# Altium footprint library Reflow3D1411sep.PcbLib: 657 footprints (part 19 of 42)
Each footprint in its own frame and in the unit in brackets; x right, y up, seen from the top. Pads: shape width x height; smd on the part's side, far side on the other; paste and mask are expansions set on the pad; w line width, h text height; cw(c..) or ccw(c..) is an arc to the next point about the centre after c.
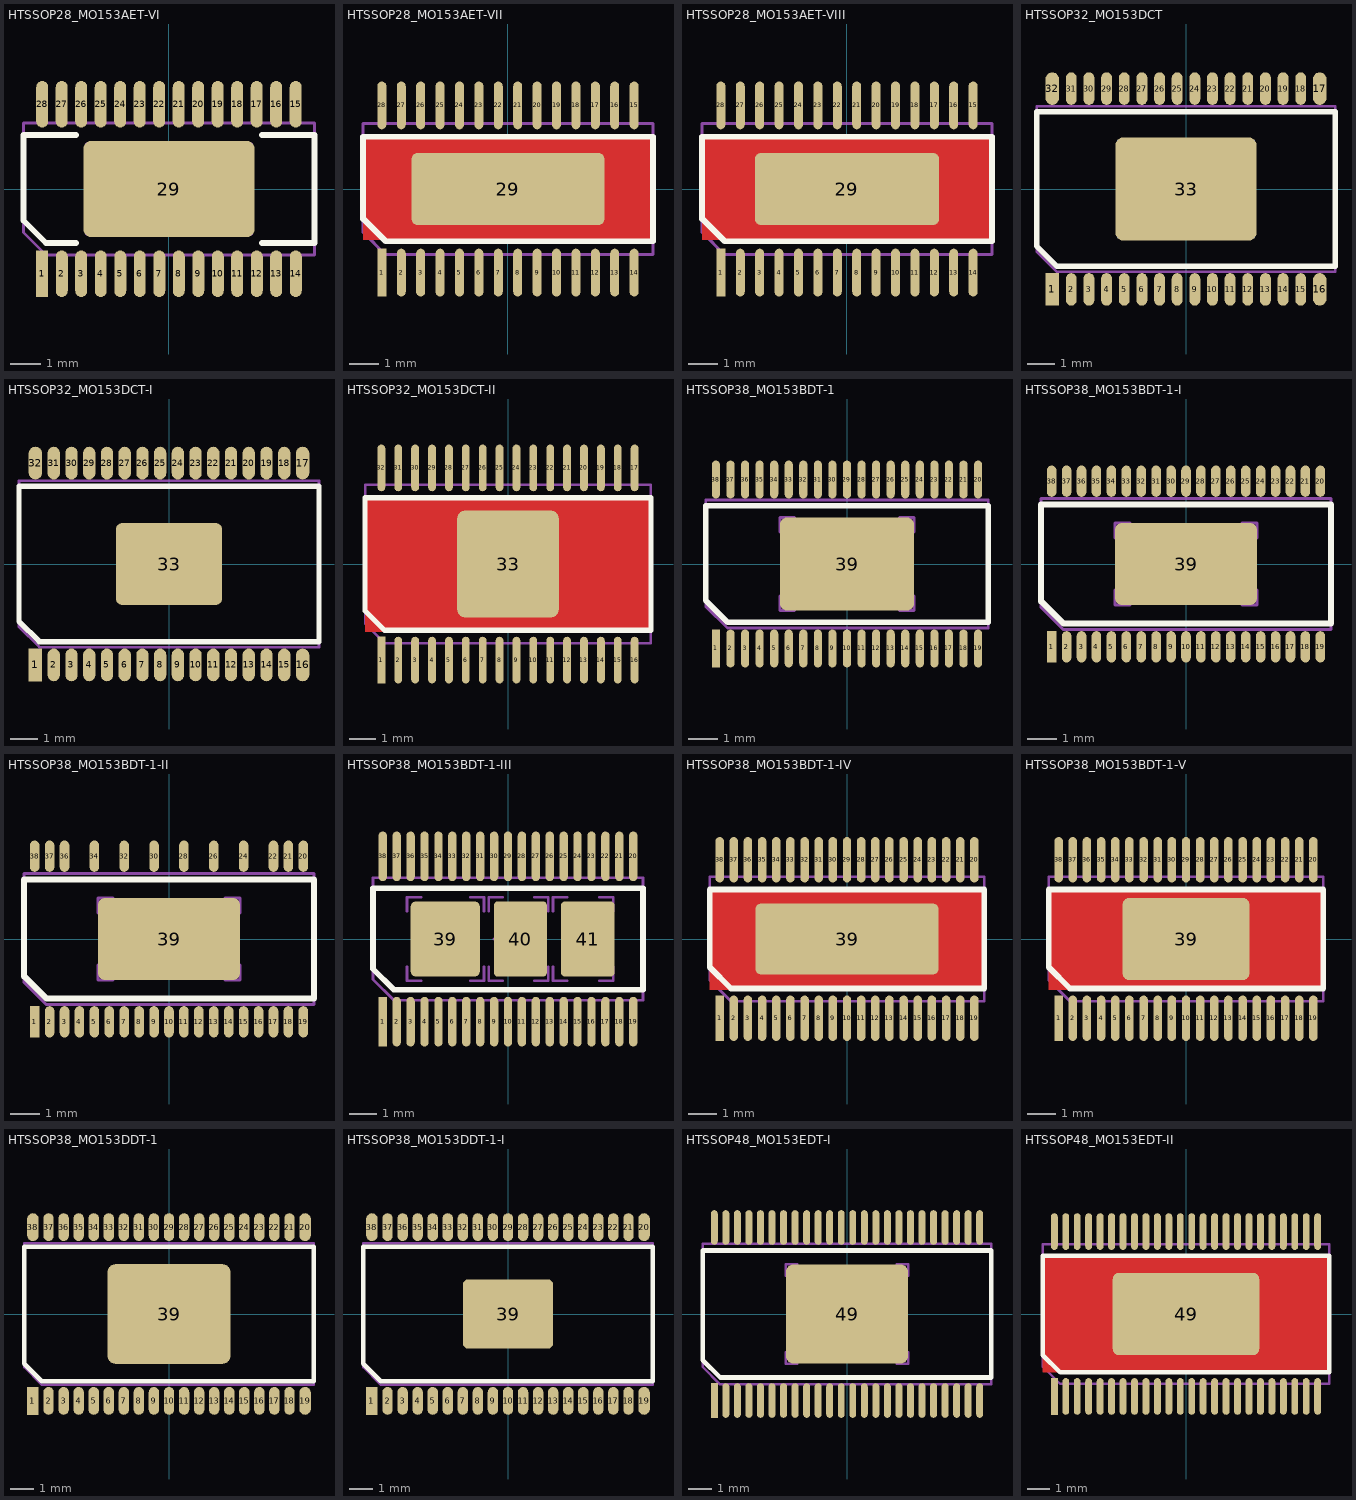
[diagram p18: the footprints below, top view; thin cyan lines are the x and y axes]

## HTSSOP28_MO153AET-VI [mm] "www.semtech.com, sc2446.pdf; www.jedec.org, MO-153f.pdf"
height 1.1
pads (29):
  rect 0.4x1.55 smd mask+0.05: 1(-4.225,-2.825)
  oval 0.4x1.55 smd mask+0.05: 2(-3.575,-2.825) 3(-2.925,-2.825) 4(-2.275,-2.825) 5(-1.625,-2.825) 6(-0.975,-2.825) 7(-0.325,-2.825) 8(0.325,-2.825) 9(0.975,-2.825) 10(1.625,-2.825) 11(2.275,-2.825) 12(2.925,-2.825) 13(3.575,-2.825) 14(4.225,-2.825) 15(4.225,2.825) 16(3.575,2.825) 17(2.925,2.825) 18(2.275,2.825) 19(1.625,2.825) 20(0.975,2.825) 21(0.325,2.825) 22(-0.325,2.825) 23(-0.975,2.825) 24(-1.625,2.825) 25(-2.275,2.825) 26(-2.925,2.825) 27(-3.575,2.825) 28(-4.225,2.825)
  rrect15% 5.7x3.2 smd mask+0.075: 29(0,0)
Top Overlay:
  lines w0.2: -3.1,-1.8 -4.1,-1.8 -4.85,-1.05 -4.85,1.8 -3.1,1.8 ; 3.1,-1.8 4.85,-1.8 4.85,1.8 3.1,1.8
Mechanical 13:
  lines w0.1: -2.75,-1 -2.75,-1.5 -2.25,-1.5 ; -2.75,1 -2.75,1.5 -2.25,1.5 ; 2.25,-1.5 2.75,-1.5 2.75,-1 ; 2.25,1.5 2.75,1.5 2.75,1 ; -4.85,-1.45 -4.1,-2.2 4.85,-2.2 4.85,2.2 -4.85,2.2 -4.85,-1.45
Mechanical 15:
  lines w0.1: -0.5,0 0.5,0 ; 0,-0.5 0,0.5
3D body: height 1.2, standoff 0, extent -4.9,-2.25 4.9,2.25

## HTSSOP28_MO153AET-VII [mm] "www.ti.com, slvs397c.pdf"
height 1.1
pads (29):
  rect 0.3x1.6 smd mask+0.075: 1(-4.225,-2.8)
  oval 0.3x1.6 smd mask+0.075: 2(-3.575,-2.8) 3(-2.925,-2.8) 4(-2.275,-2.8) 5(-1.625,-2.8) 6(-0.975,-2.8) 7(-0.325,-2.8) 8(0.325,-2.8) 9(0.975,-2.8) 10(1.625,-2.8) 11(2.275,-2.8) 12(2.925,-2.8) 13(3.575,-2.8) 14(4.225,-2.8) 15(4.225,2.8) 16(3.575,2.8) 17(2.925,2.8) 18(2.275,2.8) 19(1.625,2.8) 20(0.975,2.8) 21(0.325,2.8) 22(-0.325,2.8) 23(-0.975,2.8) 24(-1.625,2.8) 25(-2.275,2.8) 26(-2.925,2.8) 27(-3.575,2.8) 28(-4.225,2.8)
  rrect15% 6.46x2.4 smd mask+0: 29(0,0)
Top Layer:
  region: -4.85,1.7 4.85,1.7 4.85,-1.7 -4.85,-1.7
Top Overlay:
  lines w0.2: -4.85,-1 -4.1,-1.75 4.85,-1.75 4.85,1.75 -4.85,1.75 -4.85,-1
Mechanical 13:
  lines w0.1: -2.955,-0.5 -2.955,-1 -2.455,-1 ; -2.955,0.5 -2.955,1 -2.455,1 ; 2.455,-1 2.955,-1 2.955,-0.5 ; 2.455,1 2.955,1 2.955,0.5 ; -4.85,-1.45 -4.85,2.2 4.85,2.2 4.85,-2.2 -4.1,-2.2 -4.85,-1.45
Mechanical 15:
  lines w0.1: -0.5,0 0.5,0 ; 0,-0.5 0,0.5
3D body: height 1.2, standoff 0, extent -4.9,-2.25 4.9,2.25

## HTSSOP28_MO153AET-VIII [mm] "www.ti.com, tps54974.pdf"
height 1.1
pads (29):
  rect 0.3x1.6 smd mask+0.075: 1(-4.225,-2.8)
  oval 0.3x1.6 smd mask+0.075: 2(-3.575,-2.8) 3(-2.925,-2.8) 4(-2.275,-2.8) 5(-1.625,-2.8) 6(-0.975,-2.8) 7(-0.325,-2.8) 8(0.325,-2.8) 9(0.975,-2.8) 10(1.625,-2.8) 11(2.275,-2.8) 12(2.925,-2.8) 13(3.575,-2.8) 14(4.225,-2.8) 15(4.225,2.8) 16(3.575,2.8) 17(2.925,2.8) 18(2.275,2.8) 19(1.625,2.8) 20(0.975,2.8) 21(0.325,2.8) 22(-0.325,2.8) 23(-0.975,2.8) 24(-1.625,2.8) 25(-2.275,2.8) 26(-2.925,2.8) 27(-3.575,2.8) 28(-4.225,2.8)
  rrect15% 6.17x2.4 smd mask+0: 29(0,0)
Top Layer:
  region: -4.85,1.7 4.85,1.7 4.85,-1.7 -4.85,-1.7
Top Overlay:
  lines w0.2: -4.85,-1 -4.1,-1.75 4.85,-1.75 4.85,1.75 -4.85,1.75 -4.85,-1
Mechanical 13:
  lines w0.1: -2.86,-0.475 -2.86,-0.975 -2.36,-0.975 ; -2.86,0.475 -2.86,0.975 -2.36,0.975 ; 2.36,-0.975 2.86,-0.975 2.86,-0.475 ; 2.36,0.975 2.86,0.975 2.86,0.475 ; -4.85,-1.45 -4.85,2.2 4.85,2.2 4.85,-2.2 -4.1,-2.2 -4.85,-1.45
Mechanical 15:
  lines w0.1: -0.5,0 0.5,0 ; 0,-0.5 0,0.5
3D body: height 1.2, standoff 0, extent -4.9,-2.25 4.9,2.25

## HTSSOP32_MO153DCT [mm] "www.nxp.com, sot549-1_po.pdf, SOT549-1_fr.pdf"
height 1
pads (33):
  rect 0.5x1.2 smd mask+0.05: 1(-4.925,-3.7)
  oval 0.4x1.2 smd mask+0.05: 2(-4.225,-3.7) 3(-3.575,-3.7) 4(-2.925,-3.7) 5(-2.275,-3.7) 6(-1.625,-3.7) 7(-0.975,-3.7) 8(-0.325,-3.7) 9(0.325,-3.7) 10(0.975,-3.7) 11(1.625,-3.7) 12(2.275,-3.7) 13(2.925,-3.7) 14(3.575,-3.7) 15(4.225,-3.7) 18(4.225,3.7) 19(3.575,3.7) 20(2.925,3.7) 21(2.275,3.7) 22(1.625,3.7) 23(0.975,3.7) 24(0.325,3.7) 25(-0.325,3.7) 26(-0.975,3.7) 27(-1.625,3.7) 28(-2.275,3.7) 29(-2.925,3.7) 30(-3.575,3.7) 31(-4.225,3.7)
  oval 0.5x1.2 smd mask+0.05: 16(4.925,-3.7) 17(4.925,3.7) 32(-4.925,3.7)
  rrect15% 5.2x3.8 smd paste-25.4 mask+0.075: 33(0,0)
Top Overlay:
  lines w0.2: -5.5,-2.1 -5.5,2.85 5.5,2.85 5.5,-2.85 -4.75,-2.85 -5.5,-2.1
Top Paste:
  region: 2.55,-1.85 2.55,-1.05 1.55,-1.05 1.55,-1.85
  region: -2.55,-1.05 -2.55,-1.85 -1.55,-1.85 -1.55,-1.05
  region: 1.175,-1.85 1.175,-1.05 0.175,-1.05 0.175,-1.85
  region: -1.175,-1.05 -1.175,-1.85 -0.175,-1.85 -0.175,-1.05
  region: 1.175,1.05 1.175,1.85 0.175,1.85 0.175,1.05
  region: -1.175,1.85 -1.175,1.05 -0.175,1.05 -0.175,1.85
  region: 2.55,1.05 2.55,1.85 1.55,1.85 1.55,1.05
  region: -2.55,1.85 -2.55,1.05 -1.55,1.05 -1.55,1.85
  region: -2.55,0.4 -2.55,-0.4 -1.55,-0.4 -1.55,0.4
  region: 2.55,-0.4 2.55,0.4 1.55,0.4 1.55,-0.4
  region: -1.175,0.4 -1.175,-0.4 -0.175,-0.4 -0.175,0.4
  region: 1.175,-0.4 1.175,0.4 0.175,0.4 0.175,-0.4
Mechanical 13:
  lines w0.1: -2.5,-1.25 -2.5,-1.75 -2,-1.75 ; -2.5,1.25 -2.5,1.75 -2,1.75 ; 2,-1.75 2.5,-1.75 2.5,-1.25 ; 2,1.75 2.5,1.75 2.5,1.25 ; -5.5,-2.3 -5.5,3.05 5.5,3.05 5.5,-3.05 -4.75,-3.05 -5.5,-2.3
Mechanical 15:
  lines w0.1: -0.5,0 0.5,0 ; 0,-0.5 0,0.5
3D body: height 1.1, standoff 0, extent -5.55,-3.1 5.55,3.1

## HTSSOP32_MO153DCT-I [mm] "www.nxp.com, sot549-3_po.pdf, SOT549-3_fr.pdf"
height 1
pads (33):
  rect 0.5x1.2 smd mask+0.05: 1(-4.9,-3.7)
  oval 0.45x1.2 smd mask+0.05: 2(-4.225,-3.7) 3(-3.575,-3.7) 4(-2.925,-3.7) 5(-2.275,-3.7) 6(-1.625,-3.7) 7(-0.975,-3.7) 8(-0.325,-3.7) 9(0.325,-3.7) 10(0.975,-3.7) 11(1.625,-3.7) 12(2.275,-3.7) 13(2.925,-3.7) 14(3.575,-3.7) 15(4.225,-3.7) 18(4.225,3.7) 19(3.575,3.7) 20(2.925,3.7) 21(2.275,3.7) 22(1.625,3.7) 23(0.975,3.7) 24(0.325,3.7) 25(-0.325,3.7) 26(-0.975,3.7) 27(-1.625,3.7) 28(-2.275,3.7) 29(-2.925,3.7) 30(-3.575,3.7) 31(-4.225,3.7)
  oval 0.5x1.2 smd mask+0.05: 16(4.9,-3.7) 17(4.9,3.7) 32(-4.9,3.7)
  rrect15% 3.9x3 smd paste-25.4 mask+0.075: 33(0,0)
Top Overlay:
  lines w0.2: -5.5,-2.1 -4.75,-2.85 5.5,-2.85 5.5,2.85 -5.5,2.85 -5.5,-2.1
Top Paste:
  region: 0.45,-0.35 0.45,0.35 -0.45,0.35 -0.45,-0.35
  region: 1.9,-0.35 1.9,0.35 1,0.35 1,-0.35
  region: 1.9,0.75 1.9,1.45 1,1.45 1,0.75
  region: -1.9,0.35 -1.9,-0.35 -1,-0.35 -1,0.35
  region: -1.9,1.45 -1.9,0.75 -1,0.75 -1,1.45
  region: 0.45,0.75 0.45,1.45 -0.45,1.45 -0.45,0.75
  region: -0.45,-0.75 -0.45,-1.45 0.45,-1.45 0.45,-0.75
  region: 1.9,-1.45 1.9,-0.75 1,-0.75 1,-1.45
  region: -1.9,-0.75 -1.9,-1.45 -1,-1.45 -1,-0.75
Mechanical 13:
  lines w0.1: -1.775,-0.875 -1.775,-1.375 -1.275,-1.375 ; -1.775,0.875 -1.775,1.375 -1.275,1.375 ; 1.275,-1.375 1.775,-1.375 1.775,-0.875 ; 1.275,1.375 1.775,1.375 1.775,0.875 ; -5.5,-2.3 -4.75,-3.05 5.5,-3.05 5.5,3.05 -5.5,3.05 -5.5,-2.3
Mechanical 15:
  lines w0.1: -0.5,0 0.5,0 ; 0,-0.5 0,0.5
3D body: height 1.1, standoff 0, extent -5.55,-3.1 5.55,3.1

## HTSSOP32_MO153DCT-II [mm] "www.ti.com, tlc5922.pdf"
height 1.1
pads (33):
  rect 0.3x1.8 smd mask+0.075: 1(-4.875,-3.7)
  oval 0.3x1.8 smd mask+0.075: 2(-4.225,-3.7) 3(-3.575,-3.7) 4(-2.925,-3.7) 5(-2.275,-3.7) 6(-1.625,-3.7) 7(-0.975,-3.7) 8(-0.325,-3.7) 9(0.325,-3.7) 10(0.975,-3.7) 11(1.625,-3.7) 12(2.275,-3.7) 13(2.925,-3.7) 14(3.575,-3.7) 15(4.225,-3.7) 16(4.875,-3.7) 17(4.875,3.7) 18(4.225,3.7) 19(3.575,3.7) 20(2.925,3.7) 21(2.275,3.7) 22(1.625,3.7) 23(0.975,3.7) 24(0.325,3.7) 25(-0.325,3.7) 26(-0.975,3.7) 27(-1.625,3.7) 28(-2.275,3.7) 29(-2.925,3.7) 30(-3.575,3.7) 31(-4.225,3.7) 32(-4.875,3.7)
  rrect15% 3.91x4.11 smd mask+0: 33(0,0)
Top Layer:
  region: -5.5,2.6 5.5,2.6 5.5,-2.6 -5.5,-2.6
Top Overlay:
  lines w0.2: -5.5,-1.8 -4.75,-2.55 5.5,-2.55 5.5,2.55 -5.5,2.55 -5.5,-1.8
Mechanical 13:
  lines w0.1: -1.805,-1.365 -1.805,-1.865 -1.305,-1.865 ; -1.805,1.365 -1.805,1.865 -1.305,1.865 ; 1.305,-1.865 1.805,-1.865 1.805,-1.365 ; 1.305,1.865 1.805,1.865 1.805,1.365 ; -5.5,-2.3 -4.75,-3.05 5.5,-3.05 5.5,3.05 -5.5,3.05 -5.5,-2.3
Mechanical 15:
  lines w0.1: -0.5,0 0.5,0 ; 0,-0.5 0,0.5
3D body: height 1.2, standoff 0, extent -5.55,-3.1 5.55,3.1

## HTSSOP38_MO153BDT-1 [mm] "www.intersil.com, M38.173C.pdf"
height 1
pads (39):
  rect 0.28x1.3 smd mask+0.05: 1(-4.5,-2.9)
  oval 0.28x1.3 smd mask+0.05: 2(-4,-2.9) 3(-3.5,-2.9) 4(-3,-2.9) 5(-2.5,-2.9) 6(-2,-2.9) 7(-1.5,-2.9) 8(-1,-2.9) 9(-0.5,-2.9) 10(0,-2.9) 11(0.5,-2.9) 12(1,-2.9) 13(1.5,-2.9) 14(2,-2.9) 15(2.5,-2.9) 16(3,-2.9) 17(3.5,-2.9) 18(4,-2.9) 19(4.5,-2.9) 20(4.5,2.9) 21(4,2.9) 22(3.5,2.9) 23(3,2.9) 24(2.5,2.9) 25(2,2.9) 26(1.5,2.9) 27(1,2.9) 28(0.5,2.9) 29(0,2.9) 30(-0.5,2.9) 31(-1,2.9) 32(-1.5,2.9) 33(-2,2.9) 34(-2.5,2.9) 35(-3,2.9) 36(-3.5,2.9) 37(-4,2.9) 38(-4.5,2.9)
  rrect15% 4.6x3.2 smd mask+0.075: 39(0,0)
Top Overlay:
  lines w0.2: -4.85,-1.25 -4.1,-2 4.85,-2 4.85,2 -4.85,2 -4.85,-1.25
Mechanical 13:
  lines w0.1: -2.3,-1.1 -2.3,-1.6 -1.8,-1.6 ; -2.3,1.1 -2.3,1.6 -1.8,1.6 ; 1.8,-1.6 2.3,-1.6 2.3,-1.1 ; 1.8,1.6 2.3,1.6 2.3,1.1 ; -4.85,-1.45 -4.1,-2.2 4.85,-2.2 4.85,2.2 -4.85,2.2 -4.85,-1.45
Mechanical 15:
  lines w0.1: -0.5,0 0.5,0 ; 0,-0.5 0,0.5
3D body: height 1.1, standoff 0, extent -4.9,-2.25 4.9,2.25

## HTSSOP38_MO153BDT-1-I [mm] "www.linear.com, TSSOP_38_05-08-1772.pdf"
height 1.1
pads (39):
  rect 0.32x1.05 smd mask+0.075: 1(-4.5,-2.775)
  oval 0.32x1.05 smd mask+0.075: 2(-4,-2.775) 3(-3.5,-2.775) 4(-3,-2.775) 5(-2.5,-2.775) 6(-2,-2.775) 7(-1.5,-2.775) 8(-1,-2.775) 9(-0.5,-2.775) 10(0,-2.775) 11(0.5,-2.775) 12(1,-2.775) 13(1.5,-2.775) 14(2,-2.775) 15(2.5,-2.775) 16(3,-2.775) 17(3.5,-2.775) 18(4,-2.775) 19(4.5,-2.775) 20(4.5,2.775) 21(4,2.775) 22(3.5,2.775) 23(3,2.775) 24(2.5,2.775) 25(2,2.775) 26(1.5,2.775) 27(1,2.775) 28(0.5,2.775) 29(0,2.775) 30(-0.5,2.775) 31(-1,2.775) 32(-1.5,2.775) 33(-2,2.775) 34(-2.5,2.775) 35(-3,2.775) 36(-3.5,2.775) 37(-4,2.775) 38(-4.5,2.775)
  rrect15% 4.75x2.74 smd mask+0.075: 39(0,0)
Top Overlay:
  lines w0.2: -4.85,-1.25 -4.1,-2 4.85,-2 4.85,2 -4.85,2 -4.85,-1.25
Top Solder:
  region: -4.285,3.225 -4.285,2.325 -4.215,2.325 -4.215,3.225
  region: -3.785,3.225 -3.785,2.325 -3.715,2.325 -3.715,3.225
  region: -3.285,3.225 -3.285,2.325 -3.215,2.325 -3.215,3.225
  region: -2.785,3.225 -2.785,2.325 -2.715,2.325 -2.715,3.225
  region: -2.285,3.225 -2.285,2.325 -2.215,2.325 -2.215,3.225
  region: -1.785,3.225 -1.785,2.325 -1.715,2.325 -1.715,3.225
  region: -1.285,3.225 -1.285,2.325 -1.215,2.325 -1.215,3.225
  region: -0.785,3.225 -0.785,2.325 -0.715,2.325 -0.715,3.225
  region: -0.285,3.225 -0.285,2.325 -0.215,2.325 -0.215,3.225
  region: 0.215,3.225 0.215,2.325 0.285,2.325 0.285,3.225
  region: 0.715,3.225 0.715,2.325 0.785,2.325 0.785,3.225
  region: 1.215,3.225 1.215,2.325 1.285,2.325 1.285,3.225
  region: 1.715,3.225 1.715,2.325 1.785,2.325 1.785,3.225
  region: 2.215,3.225 2.215,2.325 2.285,2.325 2.285,3.225
  region: 2.715,3.225 2.715,2.325 2.785,2.325 2.785,3.225
  region: 3.215,3.225 3.215,2.325 3.285,2.325 3.285,3.225
  region: 3.715,3.225 3.715,2.325 3.785,2.325 3.785,3.225
  region: 4.215,3.225 4.215,2.325 4.285,2.325 4.285,3.225
  region: 4.215,-2.325 4.215,-3.225 4.285,-3.225 4.285,-2.325
  region: 3.715,-2.325 3.715,-3.225 3.785,-3.225 3.785,-2.325
  region: 3.215,-2.325 3.215,-3.225 3.285,-3.225 3.285,-2.325
  region: 2.715,-2.325 2.715,-3.225 2.785,-3.225 2.785,-2.325
  region: 2.215,-2.325 2.215,-3.225 2.285,-3.225 2.285,-2.325
  region: 1.715,-2.325 1.715,-3.225 1.785,-3.225 1.785,-2.325
  region: 1.215,-2.325 1.215,-3.225 1.285,-3.225 1.285,-2.325
  region: 0.715,-2.325 0.715,-3.225 0.785,-3.225 0.785,-2.325
  region: 0.215,-2.325 0.215,-3.225 0.285,-3.225 0.285,-2.325
  region: -0.285,-2.325 -0.285,-3.225 -0.215,-3.225 -0.215,-2.325
  region: -0.785,-2.325 -0.785,-3.225 -0.715,-3.225 -0.715,-2.325
  region: -1.285,-2.325 -1.285,-3.225 -1.215,-3.225 -1.215,-2.325
  region: -1.785,-2.325 -1.785,-3.225 -1.715,-3.225 -1.715,-2.325
  region: -2.285,-2.325 -2.285,-3.225 -2.215,-3.225 -2.215,-2.325
  region: -2.785,-2.325 -2.785,-3.225 -2.715,-3.225 -2.715,-2.325
  region: -3.285,-2.325 -3.285,-3.225 -3.215,-3.225 -3.215,-2.325
  region: -3.785,-2.325 -3.785,-3.225 -3.715,-3.225 -3.715,-2.325
  region: -4.27,-2.325 -4.27,-3.225 -4.215,-3.225 -4.215,-2.325
Mechanical 13:
  lines w0.1: -2.375,-0.87 -2.375,-1.37 -1.875,-1.37 ; -2.375,0.87 -2.375,1.37 -1.875,1.37 ; 1.875,-1.37 2.375,-1.37 2.375,-0.87 ; 1.875,1.37 2.375,1.37 2.375,0.87 ; -4.85,-1.45 -4.1,-2.2 4.85,-2.2 4.85,2.2 -4.85,2.2 -4.85,-1.45
Mechanical 15:
  lines w0.1: -0.5,0 0.5,0 ; 0,-0.5 0,0.5
3D body: height 1.2, standoff 0, extent -4.9,-2.25 4.9,2.25

## HTSSOP38_MO153BDT-1-II [mm] "www.linear.com, TSSOP_38_05-08-1865.pdf"
height 1.1
pads (32):
  rect 0.32x1.05 smd mask+0.075: 1(-4.5,-2.775)
  oval 0.32x1.05 smd mask+0.075: 2(-4,-2.775) 3(-3.5,-2.775) 4(-3,-2.775) 5(-2.5,-2.775) 6(-2,-2.775) 7(-1.5,-2.775) 8(-1,-2.775) 9(-0.5,-2.775) 10(0,-2.775) 11(0.5,-2.775) 12(1,-2.775) 13(1.5,-2.775) 14(2,-2.775) 15(2.5,-2.775) 16(3,-2.775) 17(3.5,-2.775) 18(4,-2.775) 19(4.5,-2.775) 20(4.5,2.775) 21(4,2.775) 22(3.5,2.775) 24(2.5,2.775) 26(1.5,2.775) 28(0.5,2.775) 30(-0.5,2.775) 32(-1.5,2.775) 34(-2.5,2.775) 36(-3.5,2.775) 37(-4,2.775) 38(-4.5,2.775)
  rrect15% 4.75x2.74 smd mask+0.075: 39(0,0)
Top Overlay:
  lines w0.2: -4.85,-1.25 -4.85,2 4.85,2 4.85,-2 -4.1,-2 -4.85,-1.25
Top Solder:
  region: -4.27,-2.325 -4.27,-3.225 -4.215,-3.225 -4.215,-2.325
  region: -3.785,-2.325 -3.785,-3.225 -3.715,-3.225 -3.715,-2.325
  region: -3.285,-2.325 -3.285,-3.225 -3.215,-3.225 -3.215,-2.325
  region: -2.785,-2.325 -2.785,-3.225 -2.715,-3.225 -2.715,-2.325
  region: -2.285,-2.325 -2.285,-3.225 -2.215,-3.225 -2.215,-2.325
  region: -1.785,-2.325 -1.785,-3.225 -1.715,-3.225 -1.715,-2.325
  region: -1.285,-2.325 -1.285,-3.225 -1.215,-3.225 -1.215,-2.325
  region: -0.785,-2.325 -0.785,-3.225 -0.715,-3.225 -0.715,-2.325
  region: -0.285,-2.325 -0.285,-3.225 -0.215,-3.225 -0.215,-2.325
  region: 0.215,-2.325 0.215,-3.225 0.285,-3.225 0.285,-2.325
  region: 0.715,-2.325 0.715,-3.225 0.785,-3.225 0.785,-2.325
  region: 1.215,-2.325 1.215,-3.225 1.285,-3.225 1.285,-2.325
  region: 1.715,-2.325 1.715,-3.225 1.785,-3.225 1.785,-2.325
  region: 2.215,-2.325 2.215,-3.225 2.285,-3.225 2.285,-2.325
  region: 2.715,-2.325 2.715,-3.225 2.785,-3.225 2.785,-2.325
  region: 3.215,-2.325 3.215,-3.225 3.285,-3.225 3.285,-2.325
  region: 3.715,-2.325 3.715,-3.225 3.785,-3.225 3.785,-2.325
  region: 4.215,-2.325 4.215,-3.225 4.285,-3.225 4.285,-2.325
  region: 4.215,3.225 4.215,2.325 4.285,2.325 4.285,3.225
  region: 3.715,3.225 3.715,2.325 3.785,2.325 3.785,3.225
  region: -3.785,3.225 -3.785,2.325 -3.715,2.325 -3.715,3.225
  region: -4.285,3.225 -4.285,2.325 -4.215,2.325 -4.215,3.225
Mechanical 13:
  lines w0.1: -2.375,-0.87 -2.375,-1.37 -1.875,-1.37 ; -2.375,0.87 -2.375,1.37 -1.875,1.37 ; 1.875,-1.37 2.375,-1.37 2.375,-0.87 ; 1.875,1.37 2.375,1.37 2.375,0.87 ; -4.85,-1.45 -4.85,2.2 4.85,2.2 4.85,-2.2 -4.1,-2.2 -4.85,-1.45
Mechanical 15:
  lines w0.1: -0.5,0 0.5,0 ; 0,-0.5 0,0.5
3D body: height 1.2, standoff 0, extent -4.9,-2.25 4.9,2.25

## HTSSOP38_MO153BDT-1-III [mm] "www.exar.com, 4b6fe087-c19f-4600-9594-d036ab0f1eee.pdf"
height 1.08
pads (41):
  rect 0.3x1.78 smd mask+0.05: 1(-4.5,-2.97)
  oval 0.3x1.78 smd mask+0.05: 2(-4,-2.97) 3(-3.5,-2.97) 4(-3,-2.97) 5(-2.5,-2.97) 6(-2,-2.97) 7(-1.5,-2.97) 8(-1,-2.97) 9(-0.5,-2.97) 10(0,-2.97) 11(0.5,-2.97) 12(1,-2.97) 13(1.5,-2.97) 14(2,-2.97) 15(2.5,-2.97) 16(3,-2.97) 17(3.5,-2.97) 18(4,-2.97) 19(4.5,-2.97) 20(4.5,2.97) 21(4,2.97) 22(3.5,2.97) 23(3,2.97) 24(2.5,2.97) 25(2,2.97) 26(1.5,2.97) 27(1,2.97) 28(0.5,2.97) 29(0,2.97) 30(-0.5,2.97) 31(-1,2.97) 32(-1.5,2.97) 33(-2,2.97) 34(-2.5,2.97) 35(-3,2.97) 36(-3.5,2.97) 37(-4,2.97) 38(-4.5,2.97)
  rrect15% 2.49x2.7 smd mask+0.075: 39(-2.255,0)
  rrect15% 1.91x2.7 smd mask+0.075: 40(0.445,0)
  rrect15% 1.93x2.7 smd mask+0.075: 41(2.865,0)
Top Overlay:
  lines w0.2: -4.85,-1.075 -4.1,-1.825 4.85,-1.825 4.85,1.825 -4.85,1.825 -4.85,-1.075
Mechanical 13:
  lines w0.1: -3.63,-1 -3.63,-1.5 -3.13,-1.5 ; -3.63,1 -3.63,1.5 -3.13,1.5 ; -1.36,-1.5 -0.86,-1.5 -0.86,-1 ; -1.36,1.5 -0.86,1.5 -0.86,1 ; -0.69,-1 -0.69,-1.5 -0.19,-1.5 ; -0.69,1 -0.69,1.5 -0.19,1.5 ; 0.95,-1.5 1.45,-1.5 1.45,-1 ; 0.95,1.5 1.45,1.5 1.45,1 ; 1.62,-1 1.62,-1.5 2.12,-1.5 ; 1.62,1 1.62,1.5 2.12,1.5 ; 3.28,-1.5 3.78,-1.5 3.78,-1 ; 3.28,1.5 3.78,1.5 3.78,1 ; -4.85,-1.45 -4.1,-2.2 4.85,-2.2 4.85,2.2 -4.85,2.2 -4.85,-1.45
Mechanical 15:
  lines w0.1: -0.5,0 0.5,0 ; 0,-0.5 0,0.5
3D body: height 1.2, standoff 0, extent -4.9,-2.25 4.9,2.25

## HTSSOP38_MO153BDT-1-IV [mm] "www.ti.com, sbos330e.pdf"
height 1.1
pads (39):
  rect 0.3x1.6 smd mask+0.05: 1(-4.5,-2.8)
  oval 0.3x1.6 smd mask+0.05: 2(-4,-2.8) 3(-3.5,-2.8) 4(-3,-2.8) 5(-2.5,-2.8) 6(-2,-2.8) 7(-1.5,-2.8) 8(-1,-2.8) 9(-0.5,-2.8) 10(0,-2.8) 11(0.5,-2.8) 12(1,-2.8) 13(1.5,-2.8) 14(2,-2.8) 15(2.5,-2.8) 16(3,-2.8) 17(3.5,-2.8) 18(4,-2.8) 19(4.5,-2.8) 20(4.5,2.8) 21(4,2.8) 22(3.5,2.8) 23(3,2.8) 24(2.5,2.8) 25(2,2.8) 26(1.5,2.8) 27(1,2.8) 28(0.5,2.8) 29(0,2.8) 30(-0.5,2.8) 31(-1,2.8) 32(-1.5,2.8) 33(-2,2.8) 34(-2.5,2.8) 35(-3,2.8) 36(-3.5,2.8) 37(-4,2.8) 38(-4.5,2.8)
  rrect15% 6.47x2.5 smd mask+0: 39(0,0)
Top Layer:
  region: -4.85,1.8 4.85,1.8 4.85,-1.8 -4.85,-1.8
Top Overlay:
  lines w0.2: -4.85,-1 -4.85,1.75 4.85,1.75 4.85,-1.75 -4.1,-1.75 -4.85,-1
Mechanical 13:
  lines w0.1: -2.86,-0.525 -2.86,-1.025 -2.36,-1.025 ; -2.86,0.525 -2.86,1.025 -2.36,1.025 ; 2.36,-1.025 2.86,-1.025 2.86,-0.525 ; 2.36,1.025 2.86,1.025 2.86,0.525 ; -4.85,-1.45 -4.85,2.2 4.85,2.2 4.85,-2.2 -4.1,-2.2 -4.85,-1.45
Mechanical 15:
  lines w0.1: -0.5,0 0.5,0 ; 0,-0.5 0,0.5
3D body: height 1.2, standoff 0, extent -4.9,-2.25 4.9,2.25

## HTSSOP38_MO153BDT-1-V [mm] "www.ti.com, tas3108.pdf"
height 1.1
pads (39):
  rect 0.3x1.6 smd mask+0.05: 1(-4.5,-2.8)
  oval 0.3x1.6 smd mask+0.05: 2(-4,-2.8) 3(-3.5,-2.8) 4(-3,-2.8) 5(-2.5,-2.8) 6(-2,-2.8) 7(-1.5,-2.8) 8(-1,-2.8) 9(-0.5,-2.8) 10(0,-2.8) 11(0.5,-2.8) 12(1,-2.8) 13(1.5,-2.8) 14(2,-2.8) 15(2.5,-2.8) 16(3,-2.8) 17(3.5,-2.8) 18(4,-2.8) 19(4.5,-2.8) 20(4.5,2.8) 21(4,2.8) 22(3.5,2.8) 23(3,2.8) 24(2.5,2.8) 25(2,2.8) 26(1.5,2.8) 27(1,2.8) 28(0.5,2.8) 29(0,2.8) 30(-0.5,2.8) 31(-1,2.8) 32(-1.5,2.8) 33(-2,2.8) 34(-2.5,2.8) 35(-3,2.8) 36(-3.5,2.8) 37(-4,2.8) 38(-4.5,2.8)
  rrect15% 4.48x2.9 smd mask+0: 39(0,0)
Top Layer:
  region: -4.85,1.8 4.85,1.8 4.85,-1.8 -4.85,-1.8
Top Overlay:
  lines w0.2: -4.85,-1 -4.1,-1.75 4.85,-1.75 4.85,1.75 -4.85,1.75 -4.85,-1
Mechanical 13:
  lines w0.1: -2.16,-0.835 -2.16,-1.335 -1.66,-1.335 ; -2.16,0.835 -2.16,1.335 -1.66,1.335 ; 1.66,-1.335 2.16,-1.335 2.16,-0.835 ; 1.66,1.335 2.16,1.335 2.16,0.835 ; -4.85,-1.45 -4.1,-2.2 4.85,-2.2 4.85,2.2 -4.85,2.2 -4.85,-1.45
Mechanical 15:
  lines w0.1: -0.5,0 0.5,0 ; 0,-0.5 0,0.5
3D body: height 1.2, standoff 0, extent -4.9,-2.25 4.9,2.25

## HTSSOP38_MO153DDT-1 [mm] "www.nxp.com, sot633-1_po.pdf, SOT633-1_fr.pdf; www.jedec.org, MO-153f.pdf"
height 1.03
pads (39):
  rect 0.5x1.2 smd mask+0.05: 1(-5.875,-3.75)
  oval 0.45x1.2 smd mask+0.05: 2(-5.2,-3.75) 3(-4.55,-3.75) 4(-3.9,-3.75) 5(-3.25,-3.75) 6(-2.6,-3.75) 7(-1.95,-3.75) 8(-1.3,-3.75) 9(-0.65,-3.75) 10(0,-3.75) 11(0.65,-3.75) 12(1.3,-3.75) 13(1.95,-3.75) 14(2.6,-3.75) 15(3.25,-3.75) 16(3.9,-3.75) 17(4.55,-3.75) 18(5.2,-3.75) 21(5.2,3.75) 22(4.55,3.75) 23(3.9,3.75) 24(3.25,3.75) 25(2.6,3.75) 26(1.95,3.75) 27(1.3,3.75) 28(0.65,3.75) 29(0,3.75) 30(-0.65,3.75) 31(-1.3,3.75) 32(-1.95,3.75) 33(-2.6,3.75) 34(-3.25,3.75) 35(-3.9,3.75) 36(-4.55,3.75) 37(-5.2,3.75)
  oval 0.5x1.2 smd mask+0.05: 19(5.875,-3.75) 20(5.875,3.75) 38(-5.875,3.75)
  rrect15% 5.3x4.3 smd paste-25.4 mask+0.075: 39(0,0)
Top Overlay:
  lines w0.2: -6.25,-2.15 -5.5,-2.9 6.25,-2.9 6.25,2.9 -6.25,2.9 -6.25,-2.15
Top Paste:
  region: 0.25,0.5 0.25,-0.5 1.15,-0.5 1.15,0.5
  region: -0.25,-0.5 -0.25,0.5 -1.15,0.5 -1.15,-0.5
  region: 1.7,0.5 1.7,-0.5 2.6,-0.5 2.6,0.5
  region: -1.7,-0.5 -1.7,0.5 -2.6,0.5 -2.6,-0.5
  region: -1.7,1.1 -1.7,2.1 -2.6,2.1 -2.6,1.1
  region: 1.7,2.1 1.7,1.1 2.6,1.1 2.6,2.1
  region: -0.25,1.1 -0.25,2.1 -1.15,2.1 -1.15,1.1
  region: 0.25,2.1 0.25,1.1 1.15,1.1 1.15,2.1
  region: -0.25,-2.1 -0.25,-1.1 -1.15,-1.1 -1.15,-2.1
  region: 0.25,-1.1 0.25,-2.1 1.15,-2.1 1.15,-1.1
  region: -1.7,-2.1 -1.7,-1.1 -2.6,-1.1 -2.6,-2.1
  region: 1.7,-1.1 1.7,-2.1 2.6,-2.1 2.6,-1.1
Mechanical 13:
  lines w0.1: -2.5,-1.5 -2.5,-2 -2,-2 ; -2.5,1.5 -2.5,2 -2,2 ; 2,-2 2.5,-2 2.5,-1.5 ; 2,2 2.5,2 2.5,1.5 ; -6.25,-2.3 -6.25,3.05 6.25,3.05 6.25,-3.05 -5.5,-3.05 -6.25,-2.3
Mechanical 15:
  lines w0.1: -0.5,0 0.5,0 ; 0,-0.5 0,0.5
3D body: height 1.2, standoff 0, extent -6.3,-3.1 6.3,3.1

## HTSSOP38_MO153DDT-1-I [mm] "www.nxp.com, SOT633-3.pdf, SOT633-3_fr.pdf"
height 1.03
pads (39):
  rect 0.5x1.2 smd mask+0.05: 1(-5.875,-3.75)
  oval 0.45x1.2 smd mask+0.05: 2(-5.2,-3.75) 3(-4.55,-3.75) 4(-3.9,-3.75) 5(-3.25,-3.75) 6(-2.6,-3.75) 7(-1.95,-3.75) 8(-1.3,-3.75) 9(-0.65,-3.75) 10(0,-3.75) 11(0.65,-3.75) 12(1.3,-3.75) 13(1.95,-3.75) 14(2.6,-3.75) 15(3.25,-3.75) 16(3.9,-3.75) 17(4.55,-3.75) 18(5.2,-3.75) 21(5.2,3.75) 22(4.55,3.75) 23(3.9,3.75) 24(3.25,3.75) 25(2.6,3.75) 26(1.95,3.75) 27(1.3,3.75) 28(0.65,3.75) 29(0,3.75) 30(-0.65,3.75) 31(-1.3,3.75) 32(-1.95,3.75) 33(-2.6,3.75) 34(-3.25,3.75) 35(-3.9,3.75) 36(-4.55,3.75) 37(-5.2,3.75)
  oval 0.5x1.2 smd mask+0.05: 19(5.875,-3.75) 20(5.875,3.75) 38(-5.875,3.75)
  rrect15% 3.9x3 smd paste-25.4 mask+0.075: 39(0,0)
Top Overlay:
  lines w0.2: -6.25,-2.15 -6.25,2.9 6.25,2.9 6.25,-2.9 -5.5,-2.9 -6.25,-2.15
Top Paste:
  region: 0.45,-0.35 0.45,0.35 -0.45,0.35 -0.45,-0.35
  region: 1.9,-0.35 1.9,0.35 1,0.35 1,-0.35
  region: 1.9,0.75 1.9,1.45 1,1.45 1,0.75
  region: -1.9,0.35 -1.9,-0.35 -1,-0.35 -1,0.35
  region: -1.9,1.45 -1.9,0.75 -1,0.75 -1,1.45
  region: 0.45,0.75 0.45,1.45 -0.45,1.45 -0.45,0.75
  region: -0.45,-0.75 -0.45,-1.45 0.45,-1.45 0.45,-0.75
  region: 1.9,-1.45 1.9,-0.75 1,-0.75 1,-1.45
  region: -1.9,-0.75 -1.9,-1.45 -1,-1.45 -1,-0.75
Mechanical 13:
  lines w0.1: -1.775,-0.875 -1.775,-1.375 -1.275,-1.375 ; -1.775,0.875 -1.775,1.375 -1.275,1.375 ; 1.275,-1.375 1.775,-1.375 1.775,-0.875 ; 1.275,1.375 1.775,1.375 1.775,0.875 ; -6.25,-2.3 -5.5,-3.05 6.25,-3.05 6.25,3.05 -6.25,3.05 -6.25,-2.3
Mechanical 15:
  lines w0.1: -0.5,0 0.5,0 ; 0,-0.5 0,0.5
3D body: height 1.2, standoff 0, extent -6.3,-3.1 6.3,3.1

## HTSSOP48_MO153EDT-I [mm] "www.idt.com, PSC4092.pdf"
height 1
pads (49):
  rect 0.3x1.5 smd mask+0.05: 1(-5.75,-3.75)
  oval 0.3x1.5 smd mask+0.05: 2(-5.25,-3.75) 3(-4.75,-3.75) 4(-4.25,-3.75) 5(-3.75,-3.75) 6(-3.25,-3.75) 7(-2.75,-3.75) 8(-2.25,-3.75) 9(-1.75,-3.75) 10(-1.25,-3.75) 11(-0.75,-3.75) 12(-0.25,-3.75) 13(0.25,-3.75) 14(0.75,-3.75) 15(1.25,-3.75) 16(1.75,-3.75) 17(2.25,-3.75) 18(2.75,-3.75) 19(3.25,-3.75) 20(3.75,-3.75) 21(4.25,-3.75) 22(4.75,-3.75) 23(5.25,-3.75) 24(5.75,-3.75) 25(5.75,3.75) 26(5.25,3.75) 27(4.75,3.75) 28(4.25,3.75) 29(3.75,3.75) 30(3.25,3.75) 31(2.75,3.75) 32(2.25,3.75) 33(1.75,3.75) 34(1.25,3.75) 35(0.75,3.75) 36(0.25,3.75) 37(-0.25,3.75) 38(-0.75,3.75) 39(-1.25,3.75) 40(-1.75,3.75) 41(-2.25,3.75) 42(-2.75,3.75) 43(-3.25,3.75) 44(-3.75,3.75) 45(-4.25,3.75) 46(-4.75,3.75) 47(-5.25,3.75) 48(-5.75,3.75)
  rrect15% 5.3x4.3 smd mask+0.075: 49(0,0)
Top Overlay:
  lines w0.2: -6.25,-2 -6.25,2.75 6.25,2.75 6.25,-2.75 -5.5,-2.75 -6.25,-2
Mechanical 13:
  lines w0.1: -2.65,-1.65 -2.65,-2.15 -2.15,-2.15 ; -2.65,1.65 -2.65,2.15 -2.15,2.15 ; 2.15,-2.15 2.65,-2.15 2.65,-1.65 ; 2.15,2.15 2.65,2.15 2.65,1.65 ; -6.25,-2.3 -6.25,3.05 6.25,3.05 6.25,-3.05 -5.5,-3.05 -6.25,-2.3
Mechanical 15:
  lines w0.1: -0.5,0 0.5,0 ; 0,-0.5 0,0.5
3D body: height 1.1, standoff 0, extent -6.3,-3.1 6.3,3.1

## HTSSOP48_MO153EDT-II [mm] "www.ti.com, pcm1691.pdf"
height 1.1
pads (49):
  rect 0.3x1.6 smd mask+0.05: 1(-5.75,-3.6)
  oval 0.3x1.6 smd mask+0.05: 2(-5.25,-3.6) 3(-4.75,-3.6) 4(-4.25,-3.6) 5(-3.75,-3.6) 6(-3.25,-3.6) 7(-2.75,-3.6) 8(-2.25,-3.6) 9(-1.75,-3.6) 10(-1.25,-3.6) 11(-0.75,-3.6) 12(-0.25,-3.6) 13(0.25,-3.6) 14(0.75,-3.6) 15(1.25,-3.6) 16(1.75,-3.6) 17(2.25,-3.6) 18(2.75,-3.6) 19(3.25,-3.6) 20(3.75,-3.6) 21(4.25,-3.6) 22(4.75,-3.6) 23(5.25,-3.6) 24(5.75,-3.6) 25(5.75,3.6) 26(5.25,3.6) 27(4.75,3.6) 28(4.25,3.6) 29(3.75,3.6) 30(3.25,3.6) 31(2.75,3.6) 32(2.25,3.6) 33(1.75,3.6) 34(1.25,3.6) 35(0.75,3.6) 36(0.25,3.6) 37(-0.25,3.6) 38(-0.75,3.6) 39(-1.25,3.6) 40(-1.75,3.6) 41(-2.25,3.6) 42(-2.75,3.6) 43(-3.25,3.6) 44(-3.75,3.6) 45(-4.25,3.6) 46(-4.75,3.6) 47(-5.25,3.6) 48(-5.75,3.6)
  rrect15% 6.4x3.6 smd mask+0: 49(0,0)
Top Layer:
  region: -6.25,2.55 6.25,2.55 6.25,-2.55 -6.25,-2.55
Top Overlay:
  lines w0.2: -6.25,-1.8 -5.5,-2.55 6.25,-2.55 6.25,2.55 -6.25,2.55 -6.25,-1.8
Mechanical 13:
  lines w0.1: -2.72,-1.03 -2.72,-1.53 -2.22,-1.53 ; -2.72,1.03 -2.72,1.53 -2.22,1.53 ; 2.22,-1.53 2.72,-1.53 2.72,-1.03 ; 2.22,1.53 2.72,1.53 2.72,1.03 ; -6.25,-2.3 -5.5,-3.05 6.25,-3.05 6.25,3.05 -6.25,3.05 -6.25,-2.3
Mechanical 15:
  lines w0.1: -0.5,0 0.5,0 ; 0,-0.5 0,0.5
3D body: height 1.2, standoff 0, extent -6.3,-3.1 6.3,3.1